# Altium footprint library Standard.PcbLib: 139 footprints (part 8 of 9)
Each footprint in its own frame and in the unit in brackets; x right, y up, seen from the top. Pads: shape width x height; smd on the part's side, far side on the other; paste and mask are expansions set on the pad; w line width, h text height; cw(c..) or ccw(c..) is an arc to the next point about the centre after c.
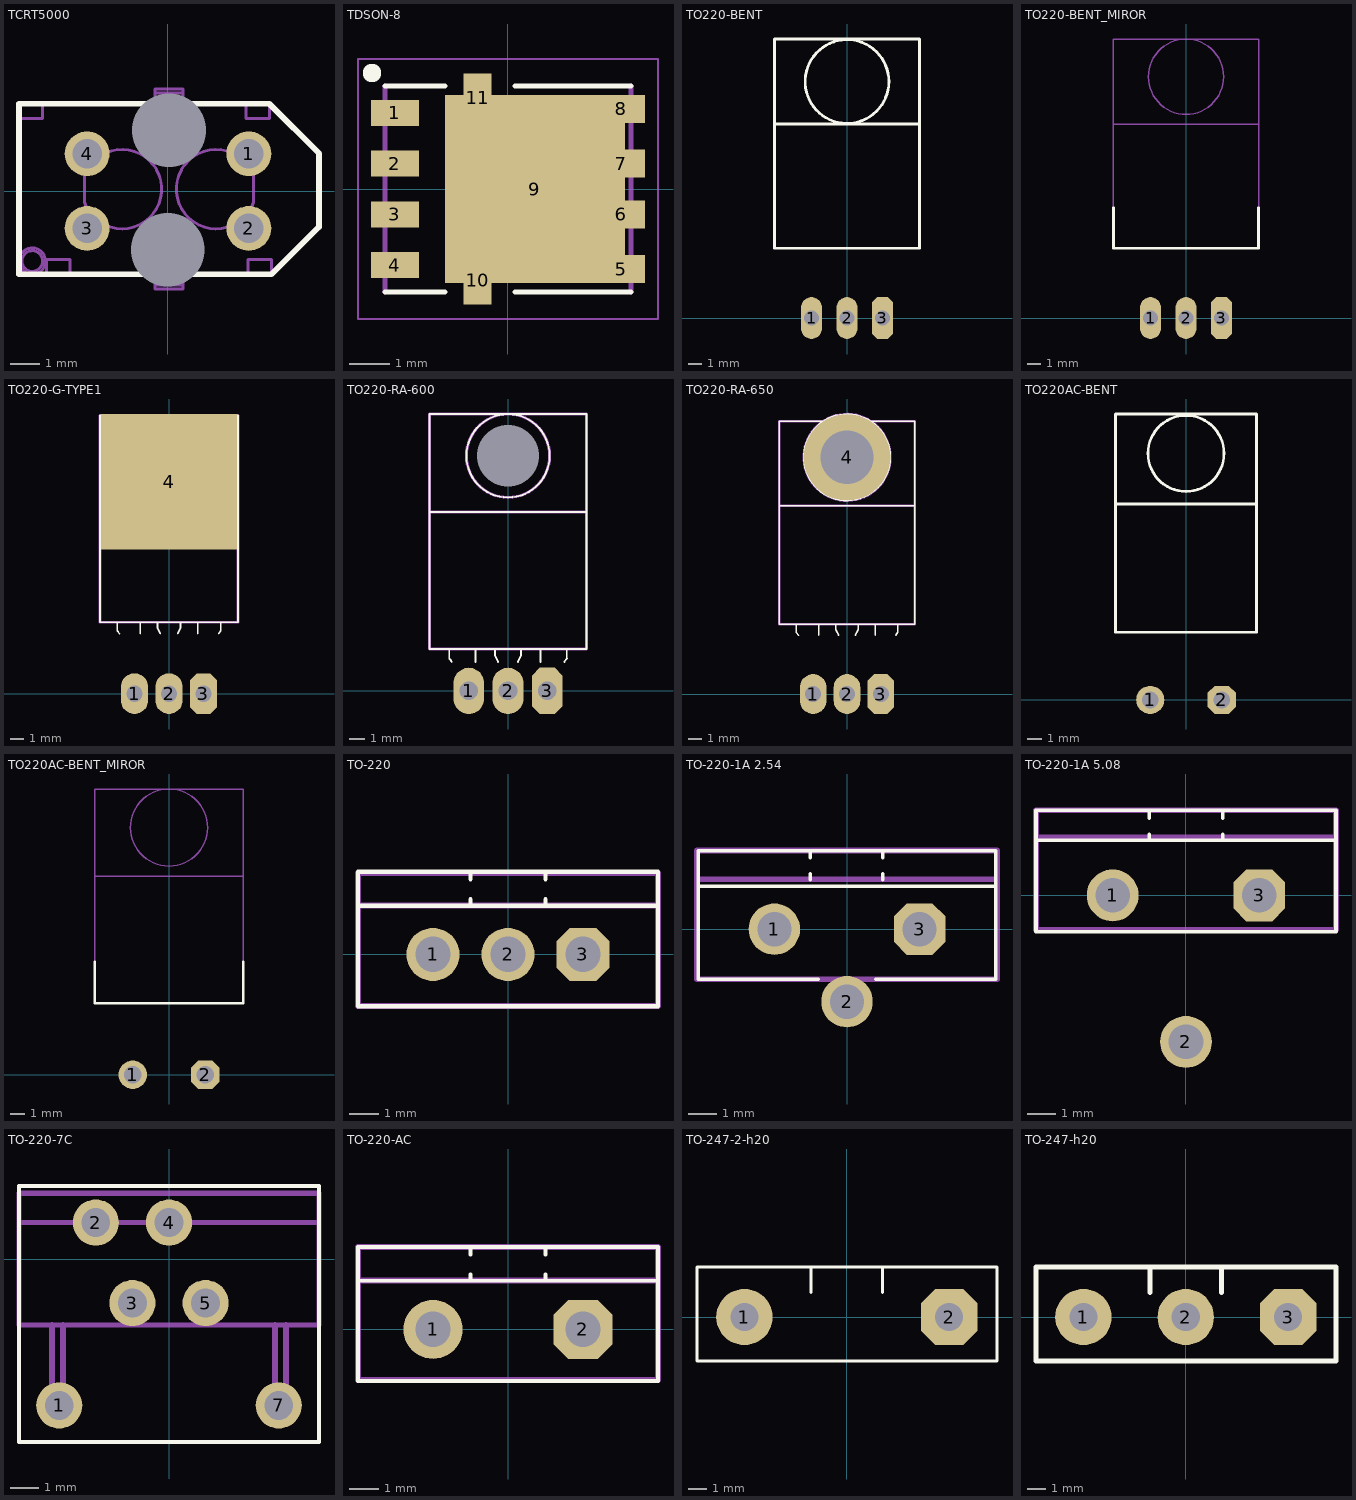
[diagram p7: the footprints below, top view; thin cyan lines are the x and y axes]

## TCRT5000 [mm]
height 18
pads (6):
  round 0 hole 2.5: 0(0,-2) 0(0.035,2.07)
  round 1.524 hole 1: 1(2.75,1.27) 2(2.75,-1.27) 3(-2.75,-1.27) 4(-2.75,1.27)
Top Overlay:
  lines w0.2: -5.065,-2.83 -5.065,2.97 3.448,2.97 5.135,1.283 5.135,-1.217 3.522,-2.83 -5.065,-2.83
Top Assembly:
  circle w0.1: c-4.615,-2.38 r0.45
  circle w0.1: c-4.615,-2.38 r0.35
  lines w0.1: -0.44,-2.83 -0.69,-2.83 ; -0.44,2.97 -0.69,2.97 ; 0.51,-2.83 0.76,-2.83 ; 0.51,2.97 0.76,2.97 ; -5.065,2.47 -4.265,2.47 -4.265,2.97 ; -5.065,2.47 -5.065,2.97 -4.265,2.97 ; -5.065,2.47 -5.065,-2.38 -5.065,-2.83 -4.615,-2.83 -4.126,-2.83 ; -4.265,2.97 -0.69,2.97 ; -4.126,-2.83 -4.126,-2.33 -3.326,-2.33 -3.326,-2.83 ; -4.126,-2.83 -3.326,-2.83 ; -3.326,-2.83 -0.69,-2.83 ; -0.69,-2.83 -0.69,-1.33 -0.44,-1.33 -0.44,-1.63 ; -0.69,2.97 -0.69,1.47 -0.44,1.47 -0.44,1.77 ; -0.44,-3.194 -0.44,-2.434 ; -0.44,-3.194 -0.44,-3.33 0.51,-3.33 0.51,-3.194 ; -0.44,-3.194 0.51,-3.194 ; -0.44,-2.434 -0.44,-2.27 ; -0.44,-2.434 0.51,-2.434 ; -0.44,-2.27 -0.44,-1.93 ; -0.44,-2.27 0.51,-2.27 ; -0.44,-1.93 -0.44,-1.63 ; -0.44,-1.93 0.51,-1.93 ; -0.44,-1.63 0.51,-1.63 ; -0.44,1.77 0.51,1.77 ; -0.44,1.77 -0.44,2.07 ; -0.44,2.07 -0.44,2.41 ; -0.44,2.07 0.51,2.07 ; -0.44,2.41 -0.44,2.574 ; -0.44,2.41 0.51,2.41 ; -0.44,2.574 -0.44,3.334 ; -0.44,2.574 0.51,2.574 ; -0.44,3.334 -0.44,3.47 0.51,3.47 0.51,3.334 ; -0.44,3.334 0.51,3.334 ; 0.51,-3.194 0.51,-2.434 ; 0.51,-2.434 0.51,-2.27 ; 0.51,-2.27 0.51,-1.93 ; 0.51,-1.93 0.51,-1.63 ; 0.51,-1.63 0.51,-1.33 0.76,-1.33 0.76,-2.83 ; 0.51,1.77 0.51,2.07 ; 0.51,1.77 0.51,1.47 0.76,1.47 0.76,2.97 ; 0.51,2.07 0.51,2.41 ; 0.51,2.41 0.51,2.574 ; 0.51,2.574 0.51,3.334 ; 0.76,-2.83 2.722,-2.83 ; 0.76,2.97 2.648,2.97 ; 2.648,2.97 2.648,2.47 3.448,2.47 3.448,2.97 ; 2.648,2.97 3.448,2.97 ; 2.722,-2.83 2.722,-2.33 3.522,-2.33 3.522,-2.83 ; 2.722,-2.83 3.522,-2.83 ; 3.448,2.97 5.135,1.283 5.135,-1.217 3.522,-2.83 ; -2.838,-0.383 ccw(c-1.565,0.066) -2.568,-0.838 -2.439,-0.8 -2.309,-0.915 -2.309,-1.061 ccw(c-1.565,0.066) -2.294,1.203 -2.294,1.041 -2.439,0.932 -2.573,0.964 ccw(c-1.565,0.066) -2.838,0.515 -2.838,-0.383 ; 2.364,1.041 2.509,0.932 2.643,0.964 cw(c1.635,0.066) 2.908,0.515 2.908,-0.383 cw(c1.635,0.066) 2.638,-0.838 2.509,-0.8 2.379,-0.915 2.379,-1.061 cw(c1.635,0.066) 2.364,1.203 2.364,1.041
3D body "User Library-corpo TCRT 5000.step": height 9.05, standoff -1.45, extent -5.065,-3.4 5.135,3.4

## TDSON-8 [mm]
height 1
pads (11):
  rect 1.2x0.65 smd: 1(-2.825,1.905) 2(-2.825,0.635) 3(-2.825,-0.635) 4(-2.825,-1.905)
  rect 1.2x0.7 smd: 5(2.825,-2) 6(2.825,-0.635) 7(2.825,0.635) 8(2.825,2)
  rect 4.5x4.7 smd: 9(0.675,0)
  rect 0.7x1.2 smd: 10(-0.762,-2.286) 11(-0.762,2.286)
Top Overlay:
  circle w0.4: c-3.4,2.9 r0.03
  lines w0.127: -3.075,-2.575 -1.575,-2.575 ; -3.075,2.575 -1.575,2.575 ; 0.175,-2.575 3.075,-2.575 ; 0.175,2.575 3.075,2.575
Top Assembly:
  lines w0.127: -3.075,-2.575 -3.075,2.575 ; 3.075,-2.575 3.075,2.575
Top Component Outline:
  lines w0.05: -3.75,-3.25 -3.75,3.25 3.75,3.25 3.75,-3.25 -3.75,-3.25
3D body "User Library-TDSON-8-1.step": height 1.05, standoff 0.05, extent -3.048,-2.667 3.102,2.683

## TO220-BENT [mm]
pads (3):
  oval 1.5x3 hole 1.1: 1(-2.54,0) 2(0,0)
  oct 1.5x3 hole 1.1: 3(2.54,0)
Top Overlay:
  circle w0.2: c0,16.95 r3
  lines w0.2: -5.2,13.9 5.2,13.9 ; -5.2,5 -5.2,20 5.2,20 5.2,5 -5.2,5
Top Assembly:
  circle w0.1: c0,16.95 r3
  lines w0.1: -5.2,13.899 5.2,13.9 ; -5.2,5.009 -5.2,20 5.2,20 5.2,5.009 -5.2,5.009
3D body "TO-220_horizontal_line.stp": height 4.7, standoff -2.95, extent -5.25,-0.3 5.25,19.95

## TO220-BENT_MIROR [mm]
pads (3):
  oval 1.5x3 hole 1.1: 1(-2.54,0) 2(0,0)
  oct 1.5x3 hole 1.1: 3(2.54,0)
Top Overlay:
  lines w0.2: -5.2,7.9 -5.2,5 5.2,5 5.2,7.9
Top Assembly:
  circle w0.1: c0,17.3 r2.7
  lines w0.1: -5.2,13.899 5.2,13.9 ; -5.2,5.009 5.2,5.009 5.2,20 -5.2,20 -5.2,5.009
3D body "TO-220_horizontal_back_line.stp": height 3.8, standoff -6.2, extent -5.25,-0.3 5.25,19.95

## TO220-G-TYPE1 [mm]
pads (4):
  oval 2x3 hole 1.2: 1(-2.54,0) 2(0,0)
  oct 2x3 hole 1.2: 3(2.54,0)
  rect 10x10 smd: 4(0,15.6)
Top Overlay:
  circle w0.125: c0,17.78 r2.7
  lines w0.125: -5.08,14.139 5.08,14.139 ; -3.81,4.614 -3.81,5.249 ; -3.762,4.582 -3.647,4.421 ; -2.117,4.421 -2.117,5.249 ; -0.847,5.249 -0.847,4.826 -0.635,4.421 ; 0.635,4.421 0.847,4.826 0.847,5.249 ; 2.117,4.421 2.117,5.249 ; 3.655,4.421 3.818,4.638 ; 3.81,4.614 3.81,5.249 ; -5.08,5.249 5.08,5.249 5.08,20.489 -5.08,20.489 -5.08,5.249
Top Assembly:
  circle w0.2: c0,17.78 r2.7
  lines w0.2: -5.08,14.139 5.08,14.139 ; -5.08,5.249 5.08,5.249 5.08,20.489 -5.08,20.489 -5.08,5.249
3D body "TO220-RA-650.STEP": height 4.45, standoff -1.79, extent -5.08,-0.19 5.08,20.36

## TO220-RA-600 [mm]
pads (4):
  oval 2x3 hole 1.2: 1(-2.54,0) 2(0,0)
  round 0 hole 4 unplated: 2(0,15.24)
  oct 2x3 hole 1.2: 3(2.54,0)
Top Overlay:
  circle w0.125: c0,15.24 r2.7
  lines w0.125: -5.08,11.599 5.08,11.599 ; -3.81,2.074 -3.81,2.709 ; -3.762,2.042 -3.647,1.881 ; -2.117,1.881 -2.117,2.709 ; -0.847,2.709 -0.847,2.286 -0.635,1.881 ; 0.635,1.881 0.847,2.286 0.847,2.709 ; 2.117,1.881 2.117,2.709 ; 3.655,1.881 3.818,2.098 ; 3.81,2.074 3.81,2.709 ; -5.08,2.709 5.08,2.709 5.08,17.949 -5.08,17.949 -5.08,2.709
Top Assembly:
  circle w0.2: c0,15.24 r2.7
  lines w0.2: -5.08,11.599 5.08,11.599 ; -5.08,2.709 5.08,2.709 5.08,17.949 -5.08,17.949 -5.08,2.709
3D body "TO220-RA-600.STEP": height 4.45, standoff -1.79, extent -5.08,-0.19 5.08,17.78

## TO220-RA-650 [mm]
pads (4):
  oval 2x3 hole 1.2: 1(-2.54,0) 2(0,0)
  oct 2x3 hole 1.2: 3(2.54,0)
  round 6.5 hole 4: 4(0,17.78)
Top Overlay:
  circle w0.125: c0,17.78 r3.25
  lines w0.125: -5.08,14.139 5.08,14.139 ; -3.81,4.614 -3.81,5.249 ; -3.762,4.582 -3.647,4.421 ; -2.117,4.421 -2.117,5.249 ; -0.847,5.249 -0.847,4.826 -0.635,4.421 ; 0.635,4.421 0.847,4.826 0.847,5.249 ; 2.117,4.421 2.117,5.249 ; 3.655,4.421 3.818,4.638 ; 3.81,4.614 3.81,5.249 ; -5.08,5.249 -5.08,20.489 5.08,20.489 5.08,5.249 -5.08,5.249
Top Assembly:
  circle w0.2: c0,17.78 r3.25
  lines w0.2: -5.08,14.139 5.08,14.139 ; -5.08,5.249 -5.08,20.489 5.08,20.489 5.08,5.249 -5.08,5.249
3D body "TO220-RA-650.STEP": height 4.45, standoff -1.79, extent -5.08,-0.19 5.08,20.36

## TO220AC-BENT [mm]
pads (2):
  round 2 hole 1.2: 1(-2.54,0)
  oct 2x2 hole 1.2: 2(2.54,0)
Top Overlay:
  circle w0.2: c0,17.5 r2.7
  lines w0.2: -5,13.9 5,13.9 ; -5,20.25 -5,4.8 5,4.8 5,20.25 ; -5,20.3 5,20.3
Top Assembly:
  circle w0.1: c0,17.5 r2.7
  lines w0.1: -5,13.899 5,13.9 ; -5,4.8 5,4.8 5,20.3 -5,20.3 -5,4.8
3D body "User Library-TO220-2pin bent.STEP": height 4.6, standoff -2.47, extent -5,-0.3 5,20.3

## TO220AC-BENT_MIROR [mm]
pads (2):
  round 2 hole 1.2: 1(-2.54,0)
  oct 2x2 hole 1.2: 2(2.54,0)
Top Overlay:
  lines w0.2: -5.2,7.9 -5.2,5 5.2,5 5.2,7.9
Top Assembly:
  circle w0.1: c0,17.3 r2.7
  lines w0.1: -5.2,13.899 5.2,13.9 ; -5.2,5.009 5.2,5.009 5.2,20 -5.2,20 -5.2,5.009
3D body "User Library-TO220-2_OR-INV.STEP": height 2.02, standoff -6.2, extent -5,-0.3 5,20.3

## TO-220 [mm]
pads (3):
  round 1.8 hole 1.2: 1(-2.54,0) 2(0,0)
  oct 1.8x1.8 hole 1.2: 3(2.54,0)
Top Overlay:
  lines w0.15: -5.08,1.651 5.08,1.651 ; -1.27,1.651 -1.27,1.863 ; -1.27,2.54 -1.27,2.794 ; 1.27,1.651 1.27,1.863 ; 1.27,2.54 1.27,2.794 ; -5.08,-1.749 5.08,-1.749 5.08,2.794 -5.08,2.794 -5.08,-1.749
Top Assembly:
  lines w0.2: -5.08,1.651 5.08,1.651 ; -5.08,-1.742 5.08,-1.742 5.08,2.758 -5.08,2.758 -5.08,-1.742
3D body "User Library-TO-220-4.STEP": height 25.06, standoff -3.74, extent -5.12,-1.742 5.08,2.758

## TO-220-1A 2.54 [mm]
pads (3):
  round 1.8 hole 1.2: 1(-2.54,0) 2(0,-2.54)
  oct 1.8x1.8 hole 1.2: 3(2.54,0)
Top Overlay:
  lines w0.125: -5.2,1.5 5.2,1.5 ; -1.29,1.734 -1.29,1.946 ; -1.29,2.496 -1.29,2.75 ; -1,-1.75 -2.525,-1.75 -5.2,-1.75 -5.2,2.75 5.2,2.75 5.2,-1.75 1,-1.75 ; 1.25,1.734 1.25,1.946 ; 1.25,2.496 1.25,2.75
Top Assembly:
  lines w0.2: -0.35,-1.75 -0.35,-2.259 ; 0.45,-1.75 0.45,-2.259 ; -5.25,1.75 -5.25,2.75 5.25,2.75 5.25,1.75 ; -5.25,1.75 5.25,1.75 ; -5.25,1.75 -5.25,1.1 -5.25,-1.75 5.25,-1.75 5.25,1.75 ; -0.35,-2.259 -0.35,-2.495 0.45,-2.495 0.45,-2.259 ; -0.35,-2.259 0.45,-2.259
3D body "TO220-1A 2.54.STEP": height 23.29, standoff -3.87, extent -5.2,-2.991 5.2,2.75

## TO-220-1A 5.08 [mm]
pads (3):
  round 1.8 hole 1.2: 1(-2.54,0) 2(0,-5.08)
  oct 1.8x1.8 hole 1.2: 3(2.54,0)
Top Overlay:
  lines w0.125: -5.2,1.905 5.2,1.905 ; -1.27,1.905 -1.27,2.117 ; -1.27,2.667 -1.27,2.921 ; 1.27,1.905 1.27,2.117 ; 1.27,2.667 1.27,2.921 ; -5.2,-1.27 5.2,-1.27 5.2,2.95 -5.2,2.95 -5.2,-1.27
Top Assembly:
  lines w0.2: -5.2,2 5.2,2 ; -5.2,-1.191 5.2,-1.191 5.2,2.95 -5.2,2.95 -5.2,-1.191
3D body "TO220-1A 5.08.STEP": height 23.29, standoff -2.41, extent -5.2,-5.331 5.2,2.95

## TO-220-7C [mm]
pads (6):
  round 1.6 hole 1: 1(-3.81,-5.08) 2(-2.54,1.27) 3(-1.27,-1.524) 4(0,1.27) 5(1.27,-1.524) 7(3.81,-5.08)
Top Overlay:
  lines w0.15: -5.207,-6.35 5.207,-6.35 5.207,2.54 -5.207,2.54 -5.207,-6.35
Top Assembly:
  lines w0.178: -5.207,1.27 5.207,1.27 ; -5.207,-2.286 5.207,-2.286 5.207,2.286 -5.207,2.286 -5.207,-2.286
  lines w0.2: -4.064,-2.286 -4.064,-5.461 -3.683,-5.461 -3.683,-5.08 -3.683,-2.286 ; 3.683,-2.286 3.683,-5.461 4.064,-5.461 4.064,-5.08 4.064,-2.286
3D body "User Library-TO-220-7C.step": height 19.26, standoff -2.18, extent -5.193,-5.463 5.207,2.667

## TO-220-AC [mm]
pads (2):
  round 2 hole 1.2: 1(-2.54,0)
  oct 2x2 hole 1.2: 2(2.54,0)
Top Overlay:
  lines w0.125: -5.08,1.651 5.08,1.651 ; -1.27,1.651 -1.27,1.863 ; -1.27,2.54 -1.27,2.794 ; 1.27,1.651 1.27,1.863 ; 1.27,2.54 1.27,2.794 ; -5.08,-1.749 5.08,-1.749 5.08,2.794 -5.08,2.794 -5.08,-1.749
Top Assembly:
  lines w0.2: -5,1.651 5,1.651 ; -5.08,-1.706 5.08,-1.706 5.08,2.794 -5.08,2.794 -5.08,-1.706
3D body "User Library-TO220-2_V-L.STEP": height 25.04, standoff -4.46, extent -5,-1.706 5,2.794

## TO-247-2-h20 [mm]
pads (2):
  round 3 hole 1.5: 1(-5.45,0)
  oct 3x3 hole 1.5: 2(5.45,0)
Top Overlay:
  lines w0.15: -1.905,1.3 -1.905,2.66 ; 1.905,1.3 1.905,2.66 ; -7.975,-2.34 -7.975,2.66 8,2.66 8,-2.34 -7.975,-2.34
3D body "User Library-TO247-2.step": height 26, standoff -15.07, extent -7.962,-2.37 7.988,2.66

## TO-247-h20 [mm]
pads (3):
  round 3 hole 1.5: 1(-5.45,0) 2(0,0)
  oct 3x3 hole 1.5: 3(5.45,0)
Top Overlay:
  lines w0.254: -1.905,1.3 -1.905,2.66 ; 1.905,1.3 1.905,2.66 ; -7.975,-2.34 -7.975,2.66 8,2.66 8,-2.34 -7.975,-2.34
Top Assembly:
  lines w0.15: 8,-2.34 8,2.66
  lines w0.2: -1.905,1.3 -1.905,2.66 ; 1.905,1.3 1.905,2.66 ; 8,-2.34 -7.975,-2.34 -7.975,2.66 8,2.66
3D body "TO247-10.STEP": height 26.2, standoff -4.38, extent -8,-2.34 8,2.66